# Altium footprint library PcbLib_Smart_Switchboard.PcbLib: 39 footprints (part 3 of 3)
Each footprint in its own frame and in the unit in brackets; x right, y up, seen from the top. Pads: shape width x height; smd on the part's side, far side on the other; paste and mask are expansions set on the pad; w line width, h text height; cw(c..) or ccw(c..) is an arc to the next point about the centre after c.
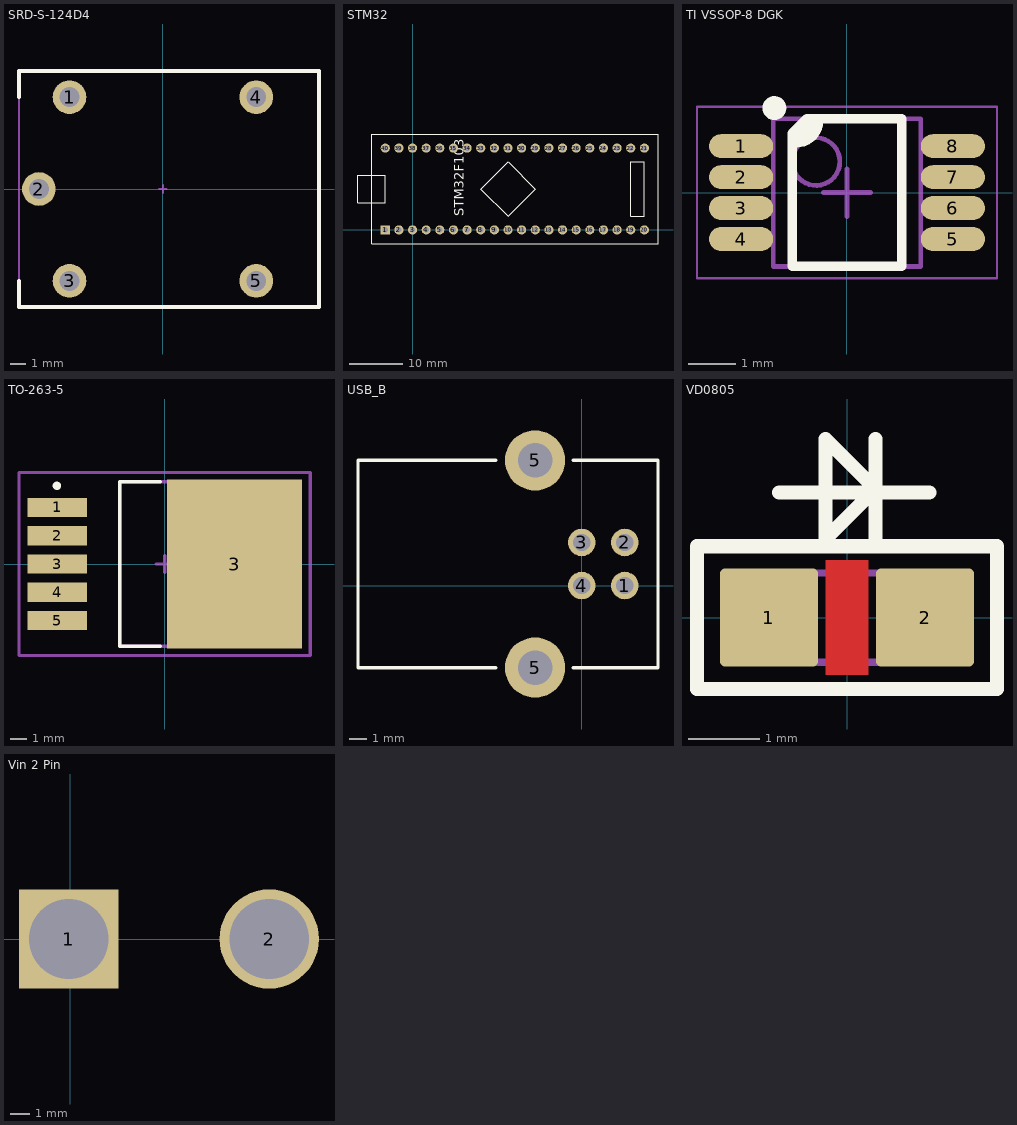
[diagram p2: the footprints below, top view; thin cyan lines are the x and y axes]

## SRD-S-124D4 [mm]
pads (5):
  round 2.2 hole 1.3: 1(-6.1,6) 2(-8.1,0) 3(-6.1,-6) 4(6.1,6) 5(6.1,-6)
Top Overlay:
  lines w0.254: -9.4,-6 -9.4,-7.7 10.2,-7.7 10.2,7.7 -9.4,7.7 -9.4,6
Mechanical 13:
  lines w0.127: -9.4,-7.7 10.2,-7.7 10.2,7.7 -9.4,7.7 -9.4,-7.7
Mechanical 15:
  lines w0.127: -0.254,0 0.254,0 ; 0,-0.254 0,0.254 ; -9.4,-7.7 10.2,-7.7 10.2,7.7 -9.4,7.7 -9.4,-7.7
3D body "relay.step": height 15.5, standoff -4.5, extent -9.4,-7.7 10.2,7.7

## STM32 [mm]
pads (40):
  rect 1.7x1.7 hole 1: 1(-5.08,0)
  round 1.7 hole 1: 2(-2.54,0) 3(0,0) 4(2.54,0) 5(5.08,0) 6(7.62,0) 7(10.16,0) 8(12.7,0) 9(15.24,0) 10(17.78,0) 11(20.32,0) 12(22.86,0) 13(25.4,0) 14(27.94,0) 15(30.48,0) 16(33.02,0) 17(35.56,0) 18(38.1,0) 19(40.64,0) 20(43.18,0) 21(43.18,15.24) 22(40.64,15.24) 23(38.1,15.24) 24(35.56,15.24) 25(33.02,15.24) 26(30.48,15.24) 27(27.94,15.24) 28(25.4,15.24) 29(22.86,15.24) 30(20.32,15.24) 31(17.78,15.24) 32(15.24,15.24) 33(12.7,15.24) 34(10.16,15.24) 35(7.62,15.24) 36(5.08,15.24) 37(2.54,15.24) 38(0,15.24) 39(-2.54,15.24) 40(-5.08,15.24)
Top Overlay:
  lines w0.2: -10.16,5.08 -10.16,10.16 -7.62,10.16 -5.08,10.16 -5.08,5.08 -10.16,5.08 ; -7.62,-2.54 -7.62,0 -7.62,17.78 45.72,17.78 45.72,-2.54 -7.62,-2.54 ; 12.7,7.62 17.78,12.7 22.86,7.62 17.78,2.54 12.7,7.62 ; 40.64,2.54 40.64,12.7 43.18,12.7 43.18,2.54 40.64,2.54
  text "STM32F103" at 10.16,2.54 h3
3D body "HEADER-WR-PHD-2.54mm-5PIN.stp": height 8.54, standoff -3, extent 31.75,13.97 44.45,16.51
3D body "HEADER-WR-PHD-2.54mm-5PIN.stp": height 8.54, standoff -3, extent 19.05,13.97 31.75,16.51
3D body "HEADER-WR-PHD-2.54mm-5PIN.stp": height 8.54, standoff -3, extent 6.35,13.97 19.05,16.51
3D body "HEADER-WR-PHD-2.54mm-5PIN.stp": height 8.54, standoff -3, extent -6.35,13.97 6.35,16.51
3D body "HEADER-WR-PHD-2.54mm-5PIN.stp": height 8.54, standoff -3, extent 31.75,-1.27 44.45,1.27
3D body "HEADER-WR-PHD-2.54mm-5PIN.stp": height 8.54, standoff -3, extent 19.05,-1.27 31.75,1.27
3D body "HEADER-WR-PHD-2.54mm-5PIN.stp": height 8.54, standoff -3, extent 6.35,-1.27 19.05,1.27
3D body "HEADER-WR-PHD-2.54mm-5PIN.stp": height 8.54, standoff -3, extent -6.35,-1.27 6.35,1.27

## TI VSSOP-8 DGK [mm] "TSOP, 8-Leads, Body 3.00x3.00mm, Pitch 0.65mm, IPC Medium Density"
height 1.1
pads (8):
  oval 1.35x0.5 smd mask+0: 1(-2.225,0.975) 2(-2.225,0.325) 3(-2.225,-0.325) 4(-2.225,-0.975) 5(2.225,-0.975) 6(2.225,-0.325) 7(2.225,0.325) 8(2.225,0.975)
Top Overlay:
  circle w0.25: c-1.525,1.775 r0.125
  region: -1,1.4 -0.6,1.5 -0.6,1.35 -0.9,1.05 -1.1,1.05
  lines w0.2: -1.1,1.05 -1.05,1.05 ccw(c-1.05,1.5) -0.6,1.5 ; -1.15,-1.55 1.15,-1.55 1.15,1.55 -0.85,1.55 -1.15,1.25 -1.15,-1.55
Mechanical 13:
  circle w0.1: c-0.65,0.65 r0.5
  lines w0.1: -1.55,-1.55 -1.55,1.55 1.55,1.55 1.55,-1.55 -1.55,-1.55
Mechanical 15:
  lines w0.05: -3.15,-1.8 -3.15,1.8 3.15,1.8 3.15,-1.8 -3.15,-1.8
  lines w0.1: -0.5,0 0.5,0 ; 0,-0.5 0,0.5
3D body "TI VSSOP-8 DGK.STEP": height 1.1, standoff 0, extent -2.45,-1.5 2.45,1.5

## TO-263-5 [mm] "D2-PAK, 6-Pads, Body 8,9x9,9mm (max), IPC Low Density"
height 4.65
pads (6):
  rect 3.6x1.15 smd mask+0: 1(-6.45,3.4) 2(-6.45,1.7) 3(-6.45,0) 4(-6.45,-1.7) 5(-6.45,-3.4)
  rect 8.1x10.15 smd paste-5: 3(4.2,0)
Top Overlay:
  circle w0.25: c-6.475,4.699 r0.125
  lines w0.2: -0.25,-4.95 -2.7,-4.95 -2.7,4.95 -0.25,4.95
Top Paste:
  rectangle: 0.254,3.683 2.159,4.953
  rectangle: 6.223,3.683 8.128,4.953
  rectangle: 2.667,3.683 5.715,4.953
  rectangle: 2.667,1.956 5.715,3.226
  rectangle: 6.223,1.956 8.128,3.226
  rectangle: 0.254,1.956 2.159,3.226
  rectangle: 2.667,0.229 5.715,1.499
  rectangle: 6.223,0.229 8.128,1.499
  rectangle: 0.254,0.229 2.159,1.499
  rectangle: 2.667,-1.499 5.715,-0.229
  rectangle: 6.223,-1.499 8.128,-0.229
  rectangle: 0.254,-1.499 2.159,-0.229
  rectangle: 2.667,-4.953 5.715,-3.683
  rectangle: 6.223,-4.953 8.128,-3.683
  rectangle: 0.254,-4.953 2.159,-3.683
  rectangle: 2.667,-3.226 5.715,-1.956
  rectangle: 6.223,-3.226 8.128,-1.956
  rectangle: 0.254,-3.226 2.159,-1.956
Mechanical 13:
  lines w0.2: -2.7,-4.95 6.19,-4.95 6.19,4.95 -2.7,4.95 -2.7,-4.95
  text ".Designator" at -2.032,2.286 h1.5
Mechanical 15:
  lines w0.2: -0.5,0 0.5,0 ; 0,-0.5 0,0.5 ; -8.75,-5.5 8.75,-5.5 8.75,5.5 -8.75,5.5 -8.75,-5.5
3D body "TO-263 5Ld.step": height 4.57, standoff -0.01, extent -7.308,-5.08 7.333,5.08

## USB_B [mm]
pads (6):
  round 1.6 hole 1 mask+0: 1(2.5,0) 2(2.5,2.5) 3(0,2.5) 4(0,0)
  round 3.5 hole 2: 5(-2.71,-4.77) 5(-2.71,7.27)
Top Overlay:
  lines w0.2: -5,-4.77 -13,-4.77 -13,7.27 -5,7.27 ; -0.5,-4.77 4.43,-4.77 4.43,7.27 -0.5,7.27

## VD0805 [mil]
pads (2):
  rrect10% 54x54 smd: 1(-43,0) 2(43,0)
Top Layer:
  pour cut-out: -11.81,31.5 -11.81,-31.49 11.81,-31.49 11.81,31.5
Top Overlay:
  lines w7.87: -37.4,68.9 -11.81,68.9 13.78,68.9 ; -11.81,39.37 -11.81,98.43 15.75,70.87 ; -11.81,43.31 15.75,70.87 ; 15.75,39.37 15.75,98.43 ; 45.28,68.9 13.78,68.9 ; 13.78,68.9 15.75,70.87 ; -82.68,-39.37 82.68,-39.37 82.68,39.37 -82.68,39.37 -82.68,-39.37
Mechanical 13:
  lines w3.94: -45.27,-24.6 45.28,-24.6 45.28,24.61 -45.27,24.61 -45.27,-24.6
Mechanical 15:
  lines w3.94: -82.68,-39.37 -82.68,39.37 82.68,39.37 82.68,-39.37 -82.68,-39.37
3D body "User Library-RES_2013-0805.step": height 29.92, standoff 0, extent -45.27,-26.57 45.28,26.58

## Vin 2 Pin [mm]
pads (2):
  rect 5x5 hole 4: 1(-0.08,0)
  round 5 hole 4: 2(10,0)